# Altium footprint library linux_corePCBLIB.PcbLib: 22 footprints (part 2 of 2)
Each footprint in its own frame and in the unit in brackets; x right, y up, seen from the top. Pads: shape width x height; smd on the part's side, far side on the other; paste and mask are expansions set on the pad; w line width, h text height; cw(c..) or ccw(c..) is an arc to the next point about the centre after c.
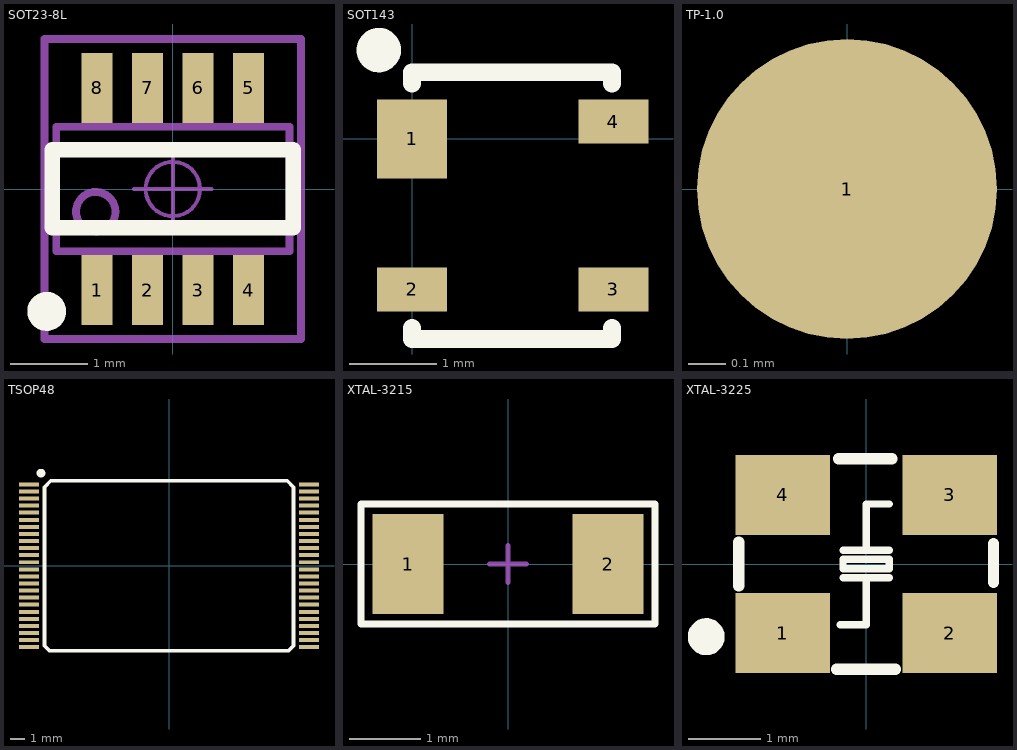
[diagram p1: the footprints below, top view; thin cyan lines are the x and y axes]

## SOT23-8L [mm]
pads (8):
  rect 0.4x0.9 smd: 1(-0.975,-1.3) 2(-0.325,-1.3) 3(0.325,-1.3) 4(0.975,-1.3) 5(0.975,1.3) 6(0.325,1.3) 7(-0.325,1.3) 8(-0.975,1.3)
Top Overlay:
  circle w0.25: c-1.624,-1.575 r0.125
  lines w0.2: -1.55,-0.5 -1.55,0.508 1.55,0.508 1.55,-0.5 -1.55,-0.5
Mechanical 13:
  circle w0.1: c-0.992,-0.292 r0.254
  lines w0.1: -1.5,-0.8 1.5,-0.8 1.5,0.8 -1.5,0.8 -1.5,-0.8
Mechanical 15:
  circle w0.05: c0,0 r0.35
  lines w0.05: -0.5,0 0.5,0 ; 0,-0.5 0,0.5
  lines w0.1: -1.65,-1.93 1.65,-1.93 1.65,1.93 -1.65,1.93 -1.65,-1.93
3D body "SOT23-8.STEP": height 1.15, standoff 0, extent -1.5,-1.403 1.5,1.403

## SOT143 [mm]
pads (4):
  rect 0.8x0.9 smd: 1(0,0)
  rect 0.8x0.5 smd: 2(0,-1.72) 3(2.3,-1.72) 4(2.3,0.2)
Top Overlay:
  circle w0.254: c-0.381,1.016 r0.127
  lines w0.203: 0,-2.159 0,-2.286 2.286,-2.286 2.286,-2.159 ; 0,0.635 0,0.762 2.286,0.762 2.286,0.635

## TP-1.0 [mm]
pads (1):
  round 0.8 smd: 1(0,0)

## TSOP48 [mm]
pads (48):
  rect 1.4x0.28 smd: 1(-9.9,5.75) 2(-9.9,5.25) 3(-9.9,4.75) 4(-9.9,4.25) 5(-9.9,3.75) 6(-9.9,3.25) 7(-9.9,2.75) 8(-9.9,2.25) 9(-9.9,1.75) 10(-9.9,1.25) 11(-9.9,0.75) 12(-9.9,0.25) 13(-9.9,-0.25) 14(-9.9,-0.75) 15(-9.9,-1.25) 16(-9.9,-1.75) 17(-9.9,-2.25) 18(-9.9,-2.75) 19(-9.9,-3.25) 20(-9.9,-3.75) 21(-9.9,-4.25) 22(-9.9,-4.75) 23(-9.9,-5.25) 24(-9.9,-5.75) 25(9.9,-5.75) 26(9.9,-5.25) 27(9.9,-4.75) 28(9.9,-4.25) 29(9.9,-3.75) 30(9.9,-3.25) 31(9.9,-2.75) 32(9.9,-2.25) 33(9.9,-1.75) 34(9.9,-1.25) 35(9.9,-0.75) 36(9.9,-0.25) 37(9.9,0.25) 38(9.9,0.75) 39(9.9,1.25) 40(9.9,1.75) 41(9.9,2.25) 42(9.9,2.75) 43(9.9,3.25) 44(9.9,3.75) 45(9.9,4.25) 46(9.9,4.75) 47(9.9,5.25) 48(9.9,5.75)
Top Overlay:
  circle w0.305: c-9.048,6.55 r0.152
  lines w0.254: -0.729,6 0.795,6 ; -0.348,6 -8.35,6 -8.8,5.55 -8.8,-5.65 -8.45,-6 8.45,-6 8.8,-5.65 8.8,5.55 8.35,6 0.668,6
3D body "User Library-SST TSOP-48.STEP": height 1.2, standoff 0, extent -10.075,-6.096 10.125,6.104

## XTAL-3215 [mm]
pads (2):
  rect 1x1.4 smd: 1(-1.4,0) 2(1.4,0)
Top Overlay:
  lines w0.1: -2.057,-0.838 -2.057,0.838 2.057,0.838 2.057,-0.838 -2.057,-0.838
Mechanical 15:
  lines w0.076: -0.254,0 0.254,0 ; 0,-0.254 0,0.254
3D body "User Library-X3215.STEP": height 0.81, standoff 0, extent -1.6,-0.75 1.6,0.75

## XTAL-3225 [mm]
pads (4):
  rect 1.3x1.1 smd: 1(-1.15,-0.95) 2(1.15,-0.95) 3(1.15,0.95) 4(-1.15,0.95)
Top Overlay:
  circle w0.254: c-2.2,-1 r0.127
  lines w0.1: -0.317,-0.19 0.318,-0.19 ; -0.317,0.191 0.318,0.191 ; 0,-0.838 0,-0.19 ; 0,0.191 0,0.826 0.318,0.826 ; -0.317,-0.063 0.318,-0.063 0.318,0.064 -0.317,0.064 -0.317,-0.063
  lines w0.102: -0.356,-0.838 0,-0.838
  lines w0.152: -1.753,-0.305 -1.753,0.305 ; -0.406,-1.448 0.406,-1.448 ; -0.381,1.448 0.356,1.448 ; 1.753,-0.254 1.753,0.279
3D body "XTAL-3225.STEP": height 0.8, standoff 0, extent -1.6,-1.245 1.6,1.255